# Altium schematic symbol library jlcpcb_2025_04_capacitors_extended_1210.schlib: 709 symbols (part 4 of 4) (continued)
## HMK325C7475KMHPE
designator C?  Capacitance: 4.7uF  (hidden comment: *)
Capacitor, Ceramic (MLCC), 4.7uF, ±10%, 100V, X7S, ±10%, SMD 1210; Manufacturer: Taiyo Yuden; Manufacturer Part Number: HMK325C7475KMHPE; Package Size: 1210; JLCPCB Basic Part: No; JLCPCB Part Number: C385986; Supplier 1: LCSC; Category: Capacitors - MLCC; Supplier Part Number 1: C385986; Tolerance: ±10%; Voltage Rating: 100V; Temperature Coefficient: X7S; RoHS: Yes; ComponentLink1Description: Datasheet; ComponentLink1URL: https://wmsc.lcsc.com/wmsc/upload/file/pdf/v2/lcsc/2211282230_Taiyo-Yuden-HMK325C7475KMHPE_C385986.pdf; ComponentLink2Description: JLCPCB Part URL; ComponentLink2URL: https://jlcpcb.com/partdetail/C385986; ComponentLink3Description: LCSC Part URL; ComponentLink3URL: https://lcsc.com/product-detail/Multilayer-Ceramic-Capacitors-MLCC---SMD-SMT_Taiyo-Yuden-Taiyo-Yuden-HMK325C7475KMHPE_C385986.html
footprint CAP-1210 (1210 (3225M) Capacitor)
pins: 1, 2

## HMK325C7475KN-TE
designator C?  Capacitance: 4.7uF  (hidden comment: *)
Capacitor, Ceramic (MLCC), 4.7uF, ±10%, 100V, X7S, ±10%, SMD 1210; Manufacturer: Taiyo Yuden; Manufacturer Part Number: HMK325C7475KN-TE; Package Size: 1210; JLCPCB Basic Part: No; JLCPCB Part Number: C697607; Supplier 1: LCSC; Category: Capacitors - MLCC; Supplier Part Number 1: C697607; Tolerance: ±10%; Voltage Rating: 100V; Temperature Coefficient: X7S; RoHS: Yes; ComponentLink1Description: Datasheet; ComponentLink1URL: https://wmsc.lcsc.com/wmsc/upload/file/pdf/v2/lcsc/2309191034_Taiyo-Yuden-HMK325C7475KN-TE_C697607.pdf; ComponentLink2Description: JLCPCB Part URL; ComponentLink2URL: https://jlcpcb.com/partdetail/C697607; ComponentLink3Description: LCSC Part URL; ComponentLink3URL: https://lcsc.com/product-detail/Multilayer-Ceramic-Capacitors-MLCC---SMD-SMT_Taiyo-Yuden-Taiyo-Yuden-HMK325C7475KN-TE_C697607.html
footprint CAP-1210 (1210 (3225M) Capacitor)
pins: 1, 2

## JMK325ABJ107MM-P
designator C?  Capacitance: 100uF  (hidden comment: *)
Capacitor, Ceramic (MLCC), 100uF, ±20%, 6.3V, X5R, ±20%, SMD 1210; Manufacturer: Taiyo Yuden; Manufacturer Part Number: JMK325ABJ107MM-P; Package Size: 1210; JLCPCB Basic Part: No; JLCPCB Part Number: C386025; Supplier 1: LCSC; Category: Capacitors - MLCC; Supplier Part Number 1: C386025; Tolerance: ±20%; Voltage Rating: 6.3V; Temperature Coefficient: X5R; RoHS: Yes; ComponentLink1Description: Datasheet; ComponentLink1URL: https://wmsc.lcsc.com/wmsc/upload/file/pdf/v2/lcsc/2304140030_Taiyo-Yuden-JMK325ABJ107MM-P_C386025.pdf; ComponentLink2Description: JLCPCB Part URL; ComponentLink2URL: https://jlcpcb.com/partdetail/C386025; ComponentLink3Description: LCSC Part URL; ComponentLink3URL: https://lcsc.com/product-detail/Multilayer-Ceramic-Capacitors-MLCC---SMD-SMT_Taiyo-Yuden-Taiyo-Yuden-JMK325ABJ107MM-P_C386025.html
footprint CAP-1210 (1210 (3225M) Capacitor)
pins: 1, 2

## JMK325ABJ107MM-T
designator C?  Capacitance: 100uF  (hidden comment: *)
Capacitor, Ceramic (MLCC), 100uF, ±20%, 6.3V, X5R, ±20%, SMD 1210; Manufacturer: Taiyo Yuden; Manufacturer Part Number: JMK325ABJ107MM-T; Package Size: 1210; JLCPCB Basic Part: No; JLCPCB Part Number: C92794; Supplier 1: LCSC; Category: Capacitors - MLCC; Supplier Part Number 1: C92794; Tolerance: ±20%; Voltage Rating: 6.3V; Temperature Coefficient: X5R; RoHS: Yes; ComponentLink1Description: Datasheet; ComponentLink1URL: https://wmsc.lcsc.com/wmsc/upload/file/pdf/v2/lcsc/1811081920_Taiyo-Yuden-JMK325ABJ107MM-T_C92794.pdf; ComponentLink2Description: JLCPCB Part URL; ComponentLink2URL: https://jlcpcb.com/partdetail/C92794; ComponentLink3Description: LCSC Part URL; ComponentLink3URL: https://lcsc.com/product-detail/Multilayer-Ceramic-Capacitors-MLCC---SMD-SMT_Taiyo-Yuden-Taiyo-Yuden-JMK325ABJ107MM-T_C92794.html
footprint CAP-1210 (1210 (3225M) Capacitor)
pins: 1, 2

## JMK325ABJ227MM-P
designator C?  Capacitance: 220uF  (hidden comment: *)
Capacitor, Ceramic (MLCC), 220uF, ±20%, 6.3V, X5R, ±20%, SMD 1210; Manufacturer: Taiyo Yuden; Manufacturer Part Number: JMK325ABJ227MM-P; Package Size: 1210; JLCPCB Basic Part: No; JLCPCB Part Number: C454524; Supplier 1: LCSC; Category: Capacitors - MLCC; Supplier Part Number 1: C454524; Tolerance: ±20%; Voltage Rating: 6.3V; Temperature Coefficient: X5R; RoHS: Yes; ComponentLink1Description: Datasheet; ComponentLink1URL: https://wmsc.lcsc.com/wmsc/upload/file/pdf/v2/lcsc/2304140030_Taiyo-Yuden-JMK325ABJ227MM-P_C454524.pdf; ComponentLink2Description: JLCPCB Part URL; ComponentLink2URL: https://jlcpcb.com/partdetail/C454524; ComponentLink3Description: LCSC Part URL; ComponentLink3URL: https://lcsc.com/product-detail/Multilayer-Ceramic-Capacitors-MLCC---SMD-SMT_Taiyo-Yuden-Taiyo-Yuden-JMK325ABJ227MM-P_C454524.html
footprint CAP-1210 (1210 (3225M) Capacitor)
pins: 1, 2

## JMK325B7476KMHPR
designator C?  Capacitance: 47uF  (hidden comment: *)
Capacitor, Ceramic (MLCC), 47uF, ±10%, 6.3V, X7R, ±10%, SMD 1210; Manufacturer: Taiyo Yuden; Manufacturer Part Number: JMK325B7476KMHPR; Package Size: 1210; JLCPCB Basic Part: No; JLCPCB Part Number: C386026; Supplier 1: LCSC; Category: Capacitors - MLCC; Supplier Part Number 1: C386026; Tolerance: ±10%; Voltage Rating: 6.3V; Temperature Coefficient: X7R; RoHS: Yes; ComponentLink1Description: Datasheet; ComponentLink1URL: https://wmsc.lcsc.com/wmsc/upload/file/pdf/v2/lcsc/2304140030_Taiyo-Yuden-JMK325B7476KMHPR_C386026.pdf; ComponentLink2Description: JLCPCB Part URL; ComponentLink2URL: https://jlcpcb.com/partdetail/C386026; ComponentLink3Description: LCSC Part URL; ComponentLink3URL: https://lcsc.com/product-detail/Multilayer-Ceramic-Capacitors-MLCC---SMD-SMT_Taiyo-Yuden-Taiyo-Yuden-JMK325B7476KMHPR_C386026.html
footprint CAP-1210 (1210 (3225M) Capacitor)
pins: 1, 2

## JMK325BJ107MM-T
designator C?  Capacitance: 100uF  (hidden comment: *)
Capacitor, Ceramic (MLCC), 100uF, ±20%, 6.3V, X5R, ±20%, SMD 1210; Manufacturer: Taiyo Yuden; Manufacturer Part Number: JMK325BJ107MM-T; Package Size: 1210; JLCPCB Basic Part: No; JLCPCB Part Number: C191180; Supplier 1: LCSC; Category: Capacitors - MLCC; Supplier Part Number 1: C191180; Tolerance: ±20%; Voltage Rating: 6.3V; Temperature Coefficient: X5R; RoHS: Yes; ComponentLink1Description: Datasheet; ComponentLink1URL: https://wmsc.lcsc.com/wmsc/upload/file/pdf/v2/lcsc/2304140030_Taiyo-Yuden-JMK325BJ107MM-T_C191180.pdf; ComponentLink2Description: JLCPCB Part URL; ComponentLink2URL: https://jlcpcb.com/partdetail/C191180; ComponentLink3Description: LCSC Part URL; ComponentLink3URL: https://lcsc.com/product-detail/Multilayer-Ceramic-Capacitors-MLCC---SMD-SMT_Taiyo-Yuden-Taiyo-Yuden-JMK325BJ107MM-T_C191180.html
footprint CAP-1210 (1210 (3225M) Capacitor)
pins: 1, 2

## JMK325BJ476MM-P
designator C?  Capacitance: 47uF  (hidden comment: *)
Capacitor, Ceramic (MLCC), 47uF, ±20%, 6.3V, X5R, ±20%, SMD 1210; Manufacturer: Taiyo Yuden; Manufacturer Part Number: JMK325BJ476MM-P; Package Size: 1210; JLCPCB Basic Part: No; JLCPCB Part Number: C386030; Supplier 1: LCSC; Category: Capacitors - MLCC; Supplier Part Number 1: C386030; Tolerance: ±20%; Voltage Rating: 6.3V; Temperature Coefficient: X5R; RoHS: Yes; ComponentLink1Description: Datasheet; ComponentLink1URL: https://wmsc.lcsc.com/wmsc/upload/file/pdf/v2/lcsc/2108160930_Taiyo-Yuden-JMK325BJ476MM-P_C386030.pdf; ComponentLink2Description: JLCPCB Part URL; ComponentLink2URL: https://jlcpcb.com/partdetail/C386030; ComponentLink3Description: LCSC Part URL; ComponentLink3URL: https://lcsc.com/product-detail/Multilayer-Ceramic-Capacitors-MLCC---SMD-SMT_Taiyo-Yuden-Taiyo-Yuden-JMK325BJ476MM-P_C386030.html
footprint CAP-1210 (1210 (3225M) Capacitor)
pins: 1, 2

## JMK325BJ476MM-T
designator C?  Capacitance: 47uF  (hidden comment: *)
Capacitor, Ceramic (MLCC), 47uF, ±20%, 6.3V, X5R, ±20%, SMD 1210; Manufacturer: Taiyo Yuden; Manufacturer Part Number: JMK325BJ476MM-T; Package Size: 1210; JLCPCB Basic Part: No; JLCPCB Part Number: C92795; Supplier 1: LCSC; Category: Capacitors - MLCC; Supplier Part Number 1: C92795; Tolerance: ±20%; Voltage Rating: 6.3V; Temperature Coefficient: X5R; RoHS: Yes; ComponentLink1Description: Datasheet; ComponentLink1URL: https://wmsc.lcsc.com/wmsc/upload/file/pdf/v2/lcsc/1810171818_Taiyo-Yuden-JMK325BJ476MM-T_C92795.pdf; ComponentLink2Description: JLCPCB Part URL; ComponentLink2URL: https://jlcpcb.com/partdetail/C92795; ComponentLink3Description: LCSC Part URL; ComponentLink3URL: https://lcsc.com/product-detail/Multilayer-Ceramic-Capacitors-MLCC---SMD-SMT_Taiyo-Yuden-Taiyo-Yuden-JMK325BJ476MM-T_C92795.html
footprint CAP-1210 (1210 (3225M) Capacitor)
pins: 1, 2

## LMK325ABJ107MM-P
designator C?  Capacitance: 100uF  (hidden comment: *)
Capacitor, Ceramic (MLCC), 100uF, ±20%, 10V, X5R, ±20%, SMD 1210; Manufacturer: Taiyo Yuden; Manufacturer Part Number: LMK325ABJ107MM-P; Package Size: 1210; JLCPCB Basic Part: No; JLCPCB Part Number: C386065; Supplier 1: LCSC; Category: Capacitors - MLCC; Supplier Part Number 1: C386065; Tolerance: ±20%; Voltage Rating: 10V; Temperature Coefficient: X5R; RoHS: Yes; ComponentLink1Description: Datasheet; ComponentLink1URL: https://wmsc.lcsc.com/wmsc/upload/file/pdf/v2/lcsc/2108161130_Taiyo-Yuden-LMK325ABJ107MM-P_C386065.pdf; ComponentLink2Description: JLCPCB Part URL; ComponentLink2URL: https://jlcpcb.com/partdetail/C386065; ComponentLink3Description: LCSC Part URL; ComponentLink3URL: https://lcsc.com/product-detail/Multilayer-Ceramic-Capacitors-MLCC---SMD-SMT_Taiyo-Yuden-Taiyo-Yuden-LMK325ABJ107MM-P_C386065.html
footprint CAP-1210 (1210 (3225M) Capacitor)
pins: 1, 2

## LMK325ABJ107MM-T
designator C?  Capacitance: 100uF  (hidden comment: *)
Capacitor, Ceramic (MLCC), 100uF, ±20%, 10V, X5R, ±20%, SMD 1210; Manufacturer: Taiyo Yuden; Manufacturer Part Number: LMK325ABJ107MM-T; Package Size: 1210; JLCPCB Basic Part: No; JLCPCB Part Number: C2880380; Supplier 1: LCSC; Category: Capacitors - MLCC; Supplier Part Number 1: C2880380; Tolerance: ±20%; Voltage Rating: 10V; Temperature Coefficient: X5R; RoHS: Yes; ComponentLink1Description: Datasheet; ComponentLink1URL: https://wmsc.lcsc.com/wmsc/upload/file/pdf/v2/lcsc/2108160930_Taiyo-Yuden-LMK325ABJ107MM-T_C2880380.pdf; ComponentLink2Description: JLCPCB Part URL; ComponentLink2URL: https://jlcpcb.com/partdetail/C2880380; ComponentLink3Description: LCSC Part URL; ComponentLink3URL: https://lcsc.com/product-detail/Multilayer-Ceramic-Capacitors-MLCC---SMD-SMT_Taiyo-Yuden-Taiyo-Yuden-LMK325ABJ107MM-T_C2880380.html
footprint CAP-1210 (1210 (3225M) Capacitor)
pins: 1, 2

## LMK325AC6107MM-P
designator C?  Capacitance: 100uF  (hidden comment: *)
Capacitor, Ceramic (MLCC), 100uF, ±20%, 10V, X6S, ±20%, SMD 1210; Manufacturer: Taiyo Yuden; Manufacturer Part Number: LMK325AC6107MM-P; Package Size: 1210; JLCPCB Basic Part: No; JLCPCB Part Number: C2179747; Supplier 1: LCSC; Category: Capacitors - MLCC; Supplier Part Number 1: C2179747; Tolerance: ±20%; Voltage Rating: 10V; Temperature Coefficient: X6S; RoHS: Yes; ComponentLink1Description: Datasheet; ComponentLink1URL: https://wmsc.lcsc.com/wmsc/upload/file/pdf/v2/lcsc/2309051423_Taiyo-Yuden-LMK325AC6107MM-P_C2179747.pdf; ComponentLink2Description: JLCPCB Part URL; ComponentLink2URL: https://jlcpcb.com/partdetail/C2179747; ComponentLink3Description: LCSC Part URL; ComponentLink3URL: https://lcsc.com/product-detail/Multilayer-Ceramic-Capacitors-MLCC---SMD-SMT_Taiyo-Yuden-Taiyo-Yuden-LMK325AC6107MM-P_C2179747.html
footprint CAP-1210 (1210 (3225M) Capacitor)
pins: 1, 2

## LMK325BJ106KN-T
designator C?  Capacitance: 10uF  (hidden comment: *)
Capacitor, Ceramic (MLCC), 10uF, ±10%, 10V, X5R, ±10%, SMD 1210; Manufacturer: Taiyo Yuden; Manufacturer Part Number: LMK325BJ106KN-T; Package Size: 1210; JLCPCB Basic Part: No; JLCPCB Part Number: C2179476; Supplier 1: LCSC; Category: Capacitors - MLCC; Supplier Part Number 1: C2179476; Tolerance: ±10%; Voltage Rating: 10V; Temperature Coefficient: X5R; RoHS: Yes; ComponentLink1Description: Datasheet; ComponentLink1URL: https://wmsc.lcsc.com/wmsc/upload/file/pdf/v2/lcsc/2309051412_Taiyo-Yuden-LMK325BJ106KN-T_C2179476.pdf; ComponentLink2Description: JLCPCB Part URL; ComponentLink2URL: https://jlcpcb.com/partdetail/C2179476; ComponentLink3Description: LCSC Part URL; ComponentLink3URL: https://lcsc.com/product-detail/Multilayer-Ceramic-Capacitors-MLCC---SMD-SMT_Taiyo-Yuden-Taiyo-Yuden-LMK325BJ106KN-T_C2179476.html
footprint CAP-1210 (1210 (3225M) Capacitor)
pins: 1, 2

## LMK325BJ107MM-T
designator C?  Capacitance: 100uF  (hidden comment: *)
Capacitor, Ceramic (MLCC), 100uF, ±20%, 10V, X5R, ±20%, SMD 1210; Manufacturer: Taiyo Yuden; Manufacturer Part Number: LMK325BJ107MM-T; Package Size: 1210; JLCPCB Basic Part: No; JLCPCB Part Number: C92822; Supplier 1: LCSC; Category: Capacitors - MLCC; Supplier Part Number 1: C92822; Tolerance: ±20%; Voltage Rating: 10V; Temperature Coefficient: X5R; RoHS: Yes; ComponentLink1Description: Datasheet; ComponentLink1URL: https://wmsc.lcsc.com/wmsc/upload/file/pdf/v2/lcsc/2211282300_Taiyo-Yuden-LMK325BJ107MM-T_C92822.pdf; ComponentLink2Description: JLCPCB Part URL; ComponentLink2URL: https://jlcpcb.com/partdetail/C92822; ComponentLink3Description: LCSC Part URL; ComponentLink3URL: https://lcsc.com/product-detail/Multilayer-Ceramic-Capacitors-MLCC---SMD-SMT_Taiyo-Yuden-Taiyo-Yuden-LMK325BJ107MM-T_C92822.html
footprint CAP-1210 (1210 (3225M) Capacitor)
pins: 1, 2

## LMK325BJ226KM-T
designator C?  Capacitance: 22uF  (hidden comment: *)
Capacitor, Ceramic (MLCC), 22uF, ±10%, 10V, X5R, ±10%, SMD 1210; Manufacturer: Taiyo Yuden; Manufacturer Part Number: LMK325BJ226KM-T; Package Size: 1210; JLCPCB Basic Part: No; JLCPCB Part Number: C92823; Supplier 1: LCSC; Category: Capacitors - MLCC; Supplier Part Number 1: C92823; Tolerance: ±10%; Voltage Rating: 10V; Temperature Coefficient: X5R; RoHS: Yes; ComponentLink1Description: Datasheet; ComponentLink1URL: https://wmsc.lcsc.com/wmsc/upload/file/pdf/v2/lcsc/1810231523_Taiyo-Yuden-LMK325BJ226KM-T_C92823.pdf; ComponentLink2Description: JLCPCB Part URL; ComponentLink2URL: https://jlcpcb.com/partdetail/C92823; ComponentLink3Description: LCSC Part URL; ComponentLink3URL: https://lcsc.com/product-detail/Multilayer-Ceramic-Capacitors-MLCC---SMD-SMT_Taiyo-Yuden-Taiyo-Yuden-LMK325BJ226KM-T_C92823.html
footprint CAP-1210 (1210 (3225M) Capacitor)
pins: 1, 2

## LMK325BJ476KMHP
designator C?  Capacitance: 47uF  (hidden comment: *)
Capacitor, Ceramic (MLCC), 47uF, ±10%, 10V, X5R, ±10%, SMD 1210; Manufacturer: Taiyo Yuden; Manufacturer Part Number: LMK325BJ476KMHP; Package Size: 1210; JLCPCB Basic Part: No; JLCPCB Part Number: C650970; Supplier 1: LCSC; Category: Capacitors - MLCC; Supplier Part Number 1: C650970; Tolerance: ±10%; Voltage Rating: 10V; Temperature Coefficient: X5R; RoHS: Yes; ComponentLink1Description: Datasheet; ComponentLink1URL: https://wmsc.lcsc.com/wmsc/upload/file/pdf/v2/lcsc/2304140030_Taiyo-Yuden-LMK325BJ476KMHP_C650970.pdf; ComponentLink2Description: JLCPCB Part URL; ComponentLink2URL: https://jlcpcb.com/partdetail/C650970; ComponentLink3Description: LCSC Part URL; ComponentLink3URL: https://lcsc.com/product-detail/Multilayer-Ceramic-Capacitors-MLCC---SMD-SMT_Taiyo-Yuden-Taiyo-Yuden-LMK325BJ476KMHP_C650970.html
footprint CAP-1210 (1210 (3225M) Capacitor)
pins: 1, 2

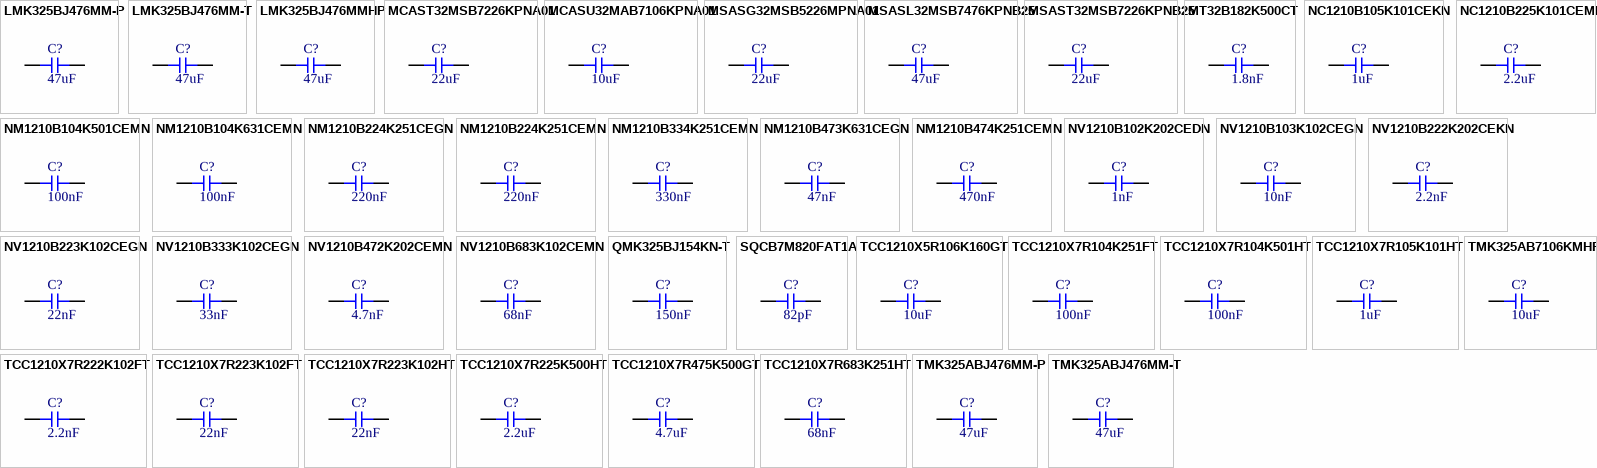
[diagram p16: symbols LMK325BJ476MM-P to TMK325ABJ476MM-T]

## LMK325BJ476MM-P
designator C?  Capacitance: 47uF  (hidden comment: *)
Capacitor, Ceramic (MLCC), 47uF, ±20%, 10V, X5R, ±20%, SMD 1210; Manufacturer: Taiyo Yuden; Manufacturer Part Number: LMK325BJ476MM-P; Package Size: 1210; JLCPCB Basic Part: No; JLCPCB Part Number: C2802164; Supplier 1: LCSC; Category: Capacitors - MLCC; Supplier Part Number 1: C2802164; Tolerance: ±20%; Voltage Rating: 10V; Temperature Coefficient: X5R; RoHS: Yes; ComponentLink1Description: Datasheet; ComponentLink1URL: https://wmsc.lcsc.com/wmsc/upload/file/pdf/v2/lcsc/2304140030_Taiyo-Yuden-LMK325BJ476MM-P_C2802164.pdf; ComponentLink2Description: JLCPCB Part URL; ComponentLink2URL: https://jlcpcb.com/partdetail/C2802164; ComponentLink3Description: LCSC Part URL; ComponentLink3URL: https://lcsc.com/product-detail/Multilayer-Ceramic-Capacitors-MLCC---SMD-SMT_Taiyo-Yuden-Taiyo-Yuden-LMK325BJ476MM-P_C2802164.html
footprint CAP-1210 (1210 (3225M) Capacitor)
pins: 1, 2

## LMK325BJ476MM-T
designator C?  Capacitance: 47uF  (hidden comment: *)
Capacitor, Ceramic (MLCC), 47uF, ±20%, 10V, X5R, ±20%, SMD 1210; Manufacturer: Taiyo Yuden; Manufacturer Part Number: LMK325BJ476MM-T; Package Size: 1210; JLCPCB Basic Part: No; JLCPCB Part Number: C92824; Supplier 1: LCSC; Category: Capacitors - MLCC; Supplier Part Number 1: C92824; Tolerance: ±20%; Voltage Rating: 10V; Temperature Coefficient: X5R; RoHS: Yes; ComponentLink1Description: Datasheet; ComponentLink1URL: https://wmsc.lcsc.com/wmsc/upload/file/pdf/v2/lcsc/2211282300_Taiyo-Yuden-LMK325BJ476MM-T_C92824.pdf; ComponentLink2Description: JLCPCB Part URL; ComponentLink2URL: https://jlcpcb.com/partdetail/C92824; ComponentLink3Description: LCSC Part URL; ComponentLink3URL: https://lcsc.com/product-detail/Multilayer-Ceramic-Capacitors-MLCC---SMD-SMT_Taiyo-Yuden-Taiyo-Yuden-LMK325BJ476MM-T_C92824.html
footprint CAP-1210 (1210 (3225M) Capacitor)
pins: 1, 2

## LMK325BJ476MMHP
designator C?  Capacitance: 47uF  (hidden comment: *)
Capacitor, Ceramic (MLCC), 47uF, ±20%, 10V, X5R, ±20%, SMD 1210; Manufacturer: Taiyo Yuden; Manufacturer Part Number: LMK325BJ476MMHP; Package Size: 1210; JLCPCB Basic Part: No; JLCPCB Part Number: C386068; Supplier 1: LCSC; Category: Capacitors - MLCC; Supplier Part Number 1: C386068; Tolerance: ±20%; Voltage Rating: 10V; Temperature Coefficient: X5R; RoHS: Yes; ComponentLink1Description: Datasheet; ComponentLink1URL: https://wmsc.lcsc.com/wmsc/upload/file/pdf/v2/lcsc/2105241210_Taiyo-Yuden-LMK325BJ476MMHP_C386068.pdf; ComponentLink2Description: JLCPCB Part URL; ComponentLink2URL: https://jlcpcb.com/partdetail/C386068; ComponentLink3Description: LCSC Part URL; ComponentLink3URL: https://lcsc.com/product-detail/Multilayer-Ceramic-Capacitors-MLCC---SMD-SMT_Taiyo-Yuden-Taiyo-Yuden-LMK325BJ476MMHP_C386068.html
footprint CAP-1210 (1210 (3225M) Capacitor)
pins: 1, 2

## MCAST32MSB7226KPNA01
designator C?  Capacitance: 22uF  (hidden comment: *)
Capacitor, Ceramic (MLCC), 22uF, ±10%, 25V, ±10%, SMD 1210; Manufacturer: Taiyo Yuden; Manufacturer Part Number: MCAST32MSB7226KPNA01; Package Size: 1210; JLCPCB Basic Part: No; JLCPCB Part Number: C5372271; Supplier 1: LCSC; Category: Capacitors - MLCC; Supplier Part Number 1: C5372271; Tolerance: ±10%; Voltage Rating: 25V; RoHS: Yes; ComponentLink1Description: Datasheet; ComponentLink1URL: https://wmsc.lcsc.com/wmsc/upload/file/pdf/v2/lcsc/2303140930_Taiyo-Yuden-MCAST32MSB7226KPNA01_C5372271.pdf; ComponentLink2Description: JLCPCB Part URL; ComponentLink2URL: https://jlcpcb.com/partdetail/C5372271; ComponentLink3Description: LCSC Part URL; ComponentLink3URL: https://lcsc.com/product-detail/Multilayer-Ceramic-Capacitors-MLCC---SMD-SMT_Taiyo-Yuden-Taiyo-Yuden-MCAST32MSB7226KPNA01_C5372271.html
footprint CAP-1210 (1210 (3225M) Capacitor)
pins: 1, 2

## MCASU32MAB7106KPNA01
designator C?  Capacitance: 10uF  (hidden comment: *)
Capacitor, Ceramic (MLCC), 10uF, ±10%, 50V, X7R, ±10%, SMD 1210; Manufacturer: Taiyo Yuden; Manufacturer Part Number: MCASU32MAB7106KPNA01; Package Size: 1210; JLCPCB Basic Part: No; JLCPCB Part Number: C5796173; Supplier 1: LCSC; Category: Capacitors - MLCC; Supplier Part Number 1: C5796173; Tolerance: ±10%; Voltage Rating: 50V; Temperature Coefficient: X7R; RoHS: Yes; ComponentLink1Description: Datasheet; ComponentLink1URL: https://wmsc.lcsc.com/wmsc/upload/file/pdf/v2/lcsc/2402010545_Taiyo-Yuden-MCASU32MAB7106KPNA01_C5796173.pdf; ComponentLink2Description: JLCPCB Part URL; ComponentLink2URL: https://jlcpcb.com/partdetail/C5796173; ComponentLink3Description: LCSC Part URL; ComponentLink3URL: https://lcsc.com/product-detail/Multilayer-Ceramic-Capacitors-MLCC---SMD-SMT_Taiyo-Yuden-Taiyo-Yuden-MCASU32MAB7106KPNA01_C5796173.html
footprint CAP-1210 (1210 (3225M) Capacitor)
pins: 1, 2

## MSASG32MSB5226MPNA01
designator C?  Capacitance: 22uF  (hidden comment: *)
Capacitor, Ceramic (MLCC), 22uF, ±20%, 35V, X5R, ±20%, SMD 1210; Manufacturer: Taiyo Yuden; Manufacturer Part Number: MSASG32MSB5226MPNA01; Package Size: 1210; JLCPCB Basic Part: No; JLCPCB Part Number: C5785350; Supplier 1: LCSC; Category: Capacitors - MLCC; Supplier Part Number 1: C5785350; Tolerance: ±20%; Voltage Rating: 35V; Temperature Coefficient: X5R; RoHS: Yes; ComponentLink1Description: Datasheet; ComponentLink2Description: JLCPCB Part URL; ComponentLink2URL: https://jlcpcb.com/partdetail/C5785350; ComponentLink3Description: LCSC Part URL; ComponentLink3URL: https://lcsc.com/product-detail/Multilayer-Ceramic-Capacitors-MLCC---SMD-SMT_Taiyo-Yuden-Taiyo-Yuden-MSASG32MSB5226MPNA01_C5785350.html
footprint CAP-1210 (1210 (3225M) Capacitor)
pins: 1, 2

## MSASL32MSB7476KPNB25
designator C?  Capacitance: 47uF  (hidden comment: *)
Capacitor, Ceramic (MLCC), 47uF, ±10%, 10V, X7R, ±10%, SMD 1210; Manufacturer: Taiyo Yuden; Manufacturer Part Number: MSASL32MSB7476KPNB25; Package Size: 1210; JLCPCB Basic Part: No; JLCPCB Part Number: C778723; Supplier 1: LCSC; Category: Capacitors - MLCC; Supplier Part Number 1: C778723; Tolerance: ±10%; Voltage Rating: 10V; Temperature Coefficient: X7R; RoHS: Yes; ComponentLink1Description: Datasheet; ComponentLink1URL: https://wmsc.lcsc.com/wmsc/upload/file/pdf/v2/lcsc/2404161124_Taiyo-Yuden-MSASL32MSB7476KPNB25_C778723.pdf; ComponentLink2Description: JLCPCB Part URL; ComponentLink2URL: https://jlcpcb.com/partdetail/C778723; ComponentLink3Description: LCSC Part URL; ComponentLink3URL: https://lcsc.com/product-detail/Multilayer-Ceramic-Capacitors-MLCC---SMD-SMT_Taiyo-Yuden-Taiyo-Yuden-MSASL32MSB7476KPNB25_C778723.html
footprint CAP-1210 (1210 (3225M) Capacitor)
pins: 1, 2

## MSAST32MSB7226KPNB25
designator C?  Capacitance: 22uF  (hidden comment: *)
Capacitor, Ceramic (MLCC), 22uF, ±10%, 25V, X7R, ±10%, SMD 1210; Manufacturer: Taiyo Yuden; Manufacturer Part Number: MSAST32MSB7226KPNB25; Package Size: 1210; JLCPCB Basic Part: No; JLCPCB Part Number: C7235328; Supplier 1: LCSC; Category: Capacitors - MLCC; Supplier Part Number 1: C7235328; Tolerance: ±10%; Voltage Rating: 25V; Temperature Coefficient: X7R; RoHS: Yes; ComponentLink1Description: Datasheet; ComponentLink2Description: JLCPCB Part URL; ComponentLink2URL: https://jlcpcb.com/partdetail/C7235328; ComponentLink3Description: LCSC Part URL; ComponentLink3URL: https://lcsc.com/product-detail/Multilayer-Ceramic-Capacitors-MLCC---SMD-SMT_Taiyo-Yuden-Taiyo-Yuden-MSAST32MSB7226KPNB25_C7235328.html
footprint CAP-1210 (1210 (3225M) Capacitor)
pins: 1, 2

## MT32B182K500CT
designator C?  Capacitance: 1.8nF  (hidden comment: *)
Capacitor, Ceramic (MLCC), 1.8nF, 50V, X7R, SMD 1210; Manufacturer: Walsin Tech Corp; Manufacturer Part Number: MT32B182K500CT; Package Size: 1210; JLCPCB Basic Part: No; JLCPCB Part Number: C2918686; Supplier 1: LCSC; Category: Capacitors - MLCC; Supplier Part Number 1: C2918686; Voltage Rating: 50V; Temperature Coefficient: X7R; RoHS: Yes; ComponentLink1Description: Datasheet; ComponentLink1URL: https://wmsc.lcsc.com/wmsc/upload/file/pdf/v2/lcsc/2111171830_Walsin-Tech-Corp-MT32B182K500CT_C2918686.pdf; ComponentLink2Description: JLCPCB Part URL; ComponentLink2URL: https://jlcpcb.com/partdetail/C2918686; ComponentLink3Description: LCSC Part URL; ComponentLink3URL: https://lcsc.com/product-detail/Multilayer-Ceramic-Capacitors-MLCC---SMD-SMT_Walsin-Tech-Corp-Walsin-Tech-Corp-MT32B182K500CT_C2918686.html
footprint CAP-1210 (1210 (3225M) Capacitor)
pins: 1, 2

## NC1210B105K101CEKN
designator C?  Capacitance: 1uF  (hidden comment: *)
Capacitor, Ceramic (MLCC), 1uF, ±10%, 100V, ±10%, SMD 1210; Manufacturer: HUI JU; Manufacturer Part Number: NC1210B105K101CEKN; Package Size: 1210; JLCPCB Basic Part: No; JLCPCB Part Number: C841573; Supplier 1: LCSC; Category: Capacitors - MLCC; Supplier Part Number 1: C841573; Tolerance: ±10%; Voltage Rating: 100V; RoHS: Yes; ComponentLink1Description: Datasheet; ComponentLink1URL: https://wmsc.lcsc.com/wmsc/upload/file/pdf/v2/lcsc/2304140030_HUI-JU-NC1210B105K101CEKN_C841573.pdf; ComponentLink2Description: JLCPCB Part URL; ComponentLink2URL: https://jlcpcb.com/partdetail/C841573; ComponentLink3Description: LCSC Part URL; ComponentLink3URL: https://lcsc.com/product-detail/Multilayer-Ceramic-Capacitors-MLCC---SMD-SMT_HUI-JU-HUI-JU-NC1210B105K101CEKN_C841573.html
footprint CAP-1210 (1210 (3225M) Capacitor)
pins: 1, 2

## NC1210B225K101CEMN
designator C?  Capacitance: 2.2uF  (hidden comment: *)
Capacitor, Ceramic (MLCC), 2.2uF, ±10%, 100V, X7R, ±10%, SMD 1210; Manufacturer: HUI JU; Manufacturer Part Number: NC1210B225K101CEMN; Package Size: 1210; JLCPCB Basic Part: No; JLCPCB Part Number: C840133; Supplier 1: LCSC; Category: Capacitors - MLCC; Supplier Part Number 1: C840133; Tolerance: ±10%; Voltage Rating: 100V; Temperature Coefficient: X7R; RoHS: Yes; ComponentLink1Description: Datasheet; ComponentLink1URL: https://wmsc.lcsc.com/wmsc/upload/file/pdf/v2/lcsc/2304140030_HUI-JU-NC1210B225K101CEMN_C840133.pdf; ComponentLink2Description: JLCPCB Part URL; ComponentLink2URL: https://jlcpcb.com/partdetail/C840133; ComponentLink3Description: LCSC Part URL; ComponentLink3URL: https://lcsc.com/product-detail/Multilayer-Ceramic-Capacitors-MLCC---SMD-SMT_HUI-JU-HUI-JU-NC1210B225K101CEMN_C840133.html
footprint CAP-1210 (1210 (3225M) Capacitor)
pins: 1, 2

## NM1210B104K501CEMN
designator C?  Capacitance: 100nF  (hidden comment: *)
Capacitor, Ceramic (MLCC), 100nF, ±10%, 500V, X7R, ±10%, SMD 1210; Manufacturer: HUI JU; Manufacturer Part Number: NM1210B104K501CEMN; Package Size: 1210; JLCPCB Basic Part: No; JLCPCB Part Number: C784430; Supplier 1: LCSC; Category: Capacitors - MLCC; Supplier Part Number 1: C784430; Tolerance: ±10%; Voltage Rating: 500V; Temperature Coefficient: X7R; RoHS: Yes; ComponentLink1Description: Datasheet; ComponentLink1URL: https://wmsc.lcsc.com/wmsc/upload/file/pdf/v2/lcsc/2304140030_HUI-JU-NM1210B104K501CEMN_C784430.pdf; ComponentLink2Description: JLCPCB Part URL; ComponentLink2URL: https://jlcpcb.com/partdetail/C784430; ComponentLink3Description: LCSC Part URL; ComponentLink3URL: https://lcsc.com/product-detail/Multilayer-Ceramic-Capacitors-MLCC---SMD-SMT_HUI-JU-HUI-JU-NM1210B104K501CEMN_C784430.html
footprint CAP-1210 (1210 (3225M) Capacitor)
pins: 1, 2

## NM1210B104K631CEMN
designator C?  Capacitance: 100nF  (hidden comment: *)
Capacitor, Ceramic (MLCC), 100nF, ±10%, 630V, ±10%, SMD 1210; Manufacturer: HUI JU; Manufacturer Part Number: NM1210B104K631CEMN; Package Size: 1210; JLCPCB Basic Part: No; JLCPCB Part Number: C784432; Supplier 1: LCSC; Category: Capacitors - MLCC; Supplier Part Number 1: C784432; Tolerance: ±10%; Voltage Rating: 630V; RoHS: Yes; ComponentLink1Description: Datasheet; ComponentLink1URL: https://wmsc.lcsc.com/wmsc/upload/file/pdf/v2/lcsc/2304140030_HUI-JU-NM1210B104K631CEMN_C784432.pdf; ComponentLink2Description: JLCPCB Part URL; ComponentLink2URL: https://jlcpcb.com/partdetail/C784432; ComponentLink3Description: LCSC Part URL; ComponentLink3URL: https://lcsc.com/product-detail/Multilayer-Ceramic-Capacitors-MLCC---SMD-SMT_HUI-JU-HUI-JU-NM1210B104K631CEMN_C784432.html
footprint CAP-1210 (1210 (3225M) Capacitor)
pins: 1, 2

## NM1210B224K251CEGN
designator C?  Capacitance: 220nF  (hidden comment: *)
Capacitor, Ceramic (MLCC), 220nF, ±10%, 250V, ±10%, SMD 1210; Manufacturer: HUI JU; Manufacturer Part Number: NM1210B224K251CEGN; Package Size: 1210; JLCPCB Basic Part: No; JLCPCB Part Number: C841576; Supplier 1: LCSC; Category: Capacitors - MLCC; Supplier Part Number 1: C841576; Tolerance: ±10%; Voltage Rating: 250V; RoHS: Yes; ComponentLink1Description: Datasheet; ComponentLink1URL: https://wmsc.lcsc.com/wmsc/upload/file/pdf/v2/lcsc/2304140030_HUI-JU-NM1210B224K251CEGN_C841576.pdf; ComponentLink2Description: JLCPCB Part URL; ComponentLink2URL: https://jlcpcb.com/partdetail/C841576; ComponentLink3Description: LCSC Part URL; ComponentLink3URL: https://lcsc.com/product-detail/Multilayer-Ceramic-Capacitors-MLCC---SMD-SMT_HUI-JU-HUI-JU-NM1210B224K251CEGN_C841576.html
footprint CAP-1210 (1210 (3225M) Capacitor)
pins: 1, 2

## NM1210B224K251CEMN
designator C?  Capacitance: 220nF  (hidden comment: *)
Capacitor, Ceramic (MLCC), 220nF, 250V, SMD 1210; Manufacturer: HUI JU; Manufacturer Part Number: NM1210B224K251CEMN; Package Size: 1210; JLCPCB Basic Part: No; JLCPCB Part Number: C2843492; Supplier 1: LCSC; Category: Capacitors - MLCC; Supplier Part Number 1: C2843492; Voltage Rating: 250V; RoHS: Yes; ComponentLink1Description: Datasheet; ComponentLink1URL: https://wmsc.lcsc.com/wmsc/upload/file/pdf/v2/lcsc/2108072030_HUI-JU-NM1210B224K251CEMN_C2843492.pdf; ComponentLink2Description: JLCPCB Part URL; ComponentLink2URL: https://jlcpcb.com/partdetail/C2843492; ComponentLink3Description: LCSC Part URL; ComponentLink3URL: https://lcsc.com/product-detail/Multilayer-Ceramic-Capacitors-MLCC---SMD-SMT_HUI-JU-HUI-JU-NM1210B224K251CEMN_C2843492.html
footprint CAP-1210 (1210 (3225M) Capacitor)
pins: 1, 2

## NM1210B334K251CEMN
designator C?  Capacitance: 330nF  (hidden comment: *)
Capacitor, Ceramic (MLCC), 330nF, ±10%, 250V, X7R, ±10%, SMD 1210; Manufacturer: HUI JU; Manufacturer Part Number: NM1210B334K251CEMN; Package Size: 1210; JLCPCB Basic Part: No; JLCPCB Part Number: C840134; Supplier 1: LCSC; Category: Capacitors - MLCC; Supplier Part Number 1: C840134; Tolerance: ±10%; Voltage Rating: 250V; Temperature Coefficient: X7R; RoHS: Yes; ComponentLink1Description: Datasheet; ComponentLink1URL: https://wmsc.lcsc.com/wmsc/upload/file/pdf/v2/lcsc/2304140030_HUI-JU-NM1210B334K251CEMN_C840134.pdf; ComponentLink2Description: JLCPCB Part URL; ComponentLink2URL: https://jlcpcb.com/partdetail/C840134; ComponentLink3Description: LCSC Part URL; ComponentLink3URL: https://lcsc.com/product-detail/Multilayer-Ceramic-Capacitors-MLCC---SMD-SMT_HUI-JU-HUI-JU-NM1210B334K251CEMN_C840134.html
footprint CAP-1210 (1210 (3225M) Capacitor)
pins: 1, 2

## NM1210B473K631CEGN
designator C?  Capacitance: 47nF  (hidden comment: *)
Capacitor, Ceramic (MLCC), 47nF, ±10%, 630V, ±10%, SMD 1210; Manufacturer: HUI JU; Manufacturer Part Number: NM1210B473K631CEGN; Package Size: 1210; JLCPCB Basic Part: No; JLCPCB Part Number: C784433; Supplier 1: LCSC; Category: Capacitors - MLCC; Supplier Part Number 1: C784433; Tolerance: ±10%; Voltage Rating: 630V; RoHS: Yes; ComponentLink1Description: Datasheet; ComponentLink1URL: https://wmsc.lcsc.com/wmsc/upload/file/pdf/v2/lcsc/2304140030_HUI-JU-NM1210B473K631CEGN_C784433.pdf; ComponentLink2Description: JLCPCB Part URL; ComponentLink2URL: https://jlcpcb.com/partdetail/C784433; ComponentLink3Description: LCSC Part URL; ComponentLink3URL: https://lcsc.com/product-detail/Multilayer-Ceramic-Capacitors-MLCC---SMD-SMT_HUI-JU-HUI-JU-NM1210B473K631CEGN_C784433.html
footprint CAP-1210 (1210 (3225M) Capacitor)
pins: 1, 2

## NM1210B474K251CEMN
designator C?  Capacitance: 470nF  (hidden comment: *)
Capacitor, Ceramic (MLCC), 470nF, ±10%, 250V, X7R, ±10%, SMD 1210; Manufacturer: HUI JU; Manufacturer Part Number: NM1210B474K251CEMN; Package Size: 1210; JLCPCB Basic Part: No; JLCPCB Part Number: C840320; Supplier 1: LCSC; Category: Capacitors - MLCC; Supplier Part Number 1: C840320; Tolerance: ±10%; Voltage Rating: 250V; Temperature Coefficient: X7R; RoHS: Yes; ComponentLink1Description: Datasheet; ComponentLink1URL: https://wmsc.lcsc.com/wmsc/upload/file/pdf/v2/lcsc/2304140030_HUI-JU-NM1210B474K251CEMN_C840320.pdf; ComponentLink2Description: JLCPCB Part URL; ComponentLink2URL: https://jlcpcb.com/partdetail/C840320; ComponentLink3Description: LCSC Part URL; ComponentLink3URL: https://lcsc.com/product-detail/Multilayer-Ceramic-Capacitors-MLCC---SMD-SMT_HUI-JU-HUI-JU-NM1210B474K251CEMN_C840320.html
footprint CAP-1210 (1210 (3225M) Capacitor)
pins: 1, 2

## NV1210B102K202CEDN
designator C?  Capacitance: 1nF  (hidden comment: *)
Capacitor, Ceramic (MLCC), 1nF, ±10%, 2kV, ±10%, SMD 1210; Manufacturer: HUI JU; Manufacturer Part Number: NV1210B102K202CEDN; Package Size: 1210; JLCPCB Basic Part: No; JLCPCB Part Number: C841569; Supplier 1: LCSC; Category: Capacitors - MLCC; Supplier Part Number 1: C841569; Tolerance: ±10%; Voltage Rating: 2kV; RoHS: Yes; ComponentLink1Description: Datasheet; ComponentLink1URL: https://wmsc.lcsc.com/wmsc/upload/file/pdf/v2/lcsc/2304140030_HUI-JU-NV1210B102K202CEDN_C841569.pdf; ComponentLink2Description: JLCPCB Part URL; ComponentLink2URL: https://jlcpcb.com/partdetail/C841569; ComponentLink3Description: LCSC Part URL; ComponentLink3URL: https://lcsc.com/product-detail/Multilayer-Ceramic-Capacitors-MLCC---SMD-SMT_HUI-JU-HUI-JU-NV1210B102K202CEDN_C841569.html
footprint CAP-1210 (1210 (3225M) Capacitor)
pins: 1, 2

## NV1210B103K102CEGN
designator C?  Capacitance: 10nF  (hidden comment: *)
Capacitor, Ceramic (MLCC), 10nF, ±10%, 1kV, ±10%, SMD 1210; Manufacturer: HUI JU; Manufacturer Part Number: NV1210B103K102CEGN; Package Size: 1210; JLCPCB Basic Part: No; JLCPCB Part Number: C841572; Supplier 1: LCSC; Category: Capacitors - MLCC; Supplier Part Number 1: C841572; Tolerance: ±10%; Voltage Rating: 1kV; RoHS: Yes; ComponentLink1Description: Datasheet; ComponentLink1URL: https://wmsc.lcsc.com/wmsc/upload/file/pdf/v2/lcsc/2304140030_HUI-JU-NV1210B103K102CEGN_C841572.pdf; ComponentLink2Description: JLCPCB Part URL; ComponentLink2URL: https://jlcpcb.com/partdetail/C841572; ComponentLink3Description: LCSC Part URL; ComponentLink3URL: https://lcsc.com/product-detail/Multilayer-Ceramic-Capacitors-MLCC---SMD-SMT_HUI-JU-HUI-JU-NV1210B103K102CEGN_C841572.html
footprint CAP-1210 (1210 (3225M) Capacitor)
pins: 1, 2

## NV1210B222K202CEKN
designator C?  Capacitance: 2.2nF  (hidden comment: *)
Capacitor, Ceramic (MLCC), 2.2nF, ±10%, 2kV, ±10%, SMD 1210; Manufacturer: HUI JU; Manufacturer Part Number: NV1210B222K202CEKN; Package Size: 1210; JLCPCB Basic Part: No; JLCPCB Part Number: C841574; Supplier 1: LCSC; Category: Capacitors - MLCC; Supplier Part Number 1: C841574; Tolerance: ±10%; Voltage Rating: 2kV; RoHS: Yes; ComponentLink1Description: Datasheet; ComponentLink1URL: https://wmsc.lcsc.com/wmsc/upload/file/pdf/v2/lcsc/2304140030_HUI-JU-NV1210B222K202CEKN_C841574.pdf; ComponentLink2Description: JLCPCB Part URL; ComponentLink2URL: https://jlcpcb.com/partdetail/C841574; ComponentLink3Description: LCSC Part URL; ComponentLink3URL: https://lcsc.com/product-detail/Multilayer-Ceramic-Capacitors-MLCC---SMD-SMT_HUI-JU-HUI-JU-NV1210B222K202CEKN_C841574.html
footprint CAP-1210 (1210 (3225M) Capacitor)
pins: 1, 2

## NV1210B223K102CEGN
designator C?  Capacitance: 22nF  (hidden comment: *)
Capacitor, Ceramic (MLCC), 22nF, ±10%, 1kV, ±10%, SMD 1210; Manufacturer: HUI JU; Manufacturer Part Number: NV1210B223K102CEGN; Package Size: 1210; JLCPCB Basic Part: No; JLCPCB Part Number: C841575; Supplier 1: LCSC; Category: Capacitors - MLCC; Supplier Part Number 1: C841575; Tolerance: ±10%; Voltage Rating: 1kV; RoHS: Yes; ComponentLink1Description: Datasheet; ComponentLink1URL: https://wmsc.lcsc.com/wmsc/upload/file/pdf/v2/lcsc/2304140030_HUI-JU-NV1210B223K102CEGN_C841575.pdf; ComponentLink2Description: JLCPCB Part URL; ComponentLink2URL: https://jlcpcb.com/partdetail/C841575; ComponentLink3Description: LCSC Part URL; ComponentLink3URL: https://lcsc.com/product-detail/Multilayer-Ceramic-Capacitors-MLCC---SMD-SMT_HUI-JU-HUI-JU-NV1210B223K102CEGN_C841575.html
footprint CAP-1210 (1210 (3225M) Capacitor)
pins: 1, 2

## NV1210B333K102CEGN
designator C?  Capacitance: 33nF  (hidden comment: *)
Capacitor, Ceramic (MLCC), 33nF, ±10%, 1kV, X7R, ±10%, SMD 1210; Manufacturer: HUI JU; Manufacturer Part Number: NV1210B333K102CEGN; Package Size: 1210; JLCPCB Basic Part: No; JLCPCB Part Number: C720962; Supplier 1: LCSC; Category: Capacitors - MLCC; Supplier Part Number 1: C720962; Tolerance: ±10%; Voltage Rating: 1kV; Temperature Coefficient: X7R; RoHS: Yes; ComponentLink1Description: Datasheet; ComponentLink1URL: https://wmsc.lcsc.com/wmsc/upload/file/pdf/v2/lcsc/2304140030_HUI-JU-NV1210B333K102CEGN_C720962.pdf; ComponentLink2Description: JLCPCB Part URL; ComponentLink2URL: https://jlcpcb.com/partdetail/C720962; ComponentLink3Description: LCSC Part URL; ComponentLink3URL: https://lcsc.com/product-detail/Multilayer-Ceramic-Capacitors-MLCC---SMD-SMT_HUI-JU-HUI-JU-NV1210B333K102CEGN_C720962.html
footprint CAP-1210 (1210 (3225M) Capacitor)
pins: 1, 2

## NV1210B472K202CEMN
designator C?  Capacitance: 4.7nF  (hidden comment: *)
Capacitor, Ceramic (MLCC), 4.7nF, 2kV, X7R, SMD 1210; Manufacturer: HUI JU; Manufacturer Part Number: NV1210B472K202CEMN; Package Size: 1210; JLCPCB Basic Part: No; JLCPCB Part Number: C2843493; Supplier 1: LCSC; Category: Capacitors - MLCC; Supplier Part Number 1: C2843493; Voltage Rating: 2kV; Temperature Coefficient: X7R; RoHS: Yes; ComponentLink1Description: Datasheet; ComponentLink1URL: https://wmsc.lcsc.com/wmsc/upload/file/pdf/v2/lcsc/2201201730_HUI-JU-NV1210B472K202CEMN_C2843493.pdf; ComponentLink2Description: JLCPCB Part URL; ComponentLink2URL: https://jlcpcb.com/partdetail/C2843493; ComponentLink3Description: LCSC Part URL; ComponentLink3URL: https://lcsc.com/product-detail/Multilayer-Ceramic-Capacitors-MLCC---SMD-SMT_HUI-JU-HUI-JU-NV1210B472K202CEMN_C2843493.html
footprint CAP-1210 (1210 (3225M) Capacitor)
pins: 1, 2

## NV1210B683K102CEMN
designator C?  Capacitance: 68nF  (hidden comment: *)
Capacitor, Ceramic (MLCC), 68nF, ±10%, 1kV, X7R, ±10%, SMD 1210; Manufacturer: HUI JU; Manufacturer Part Number: NV1210B683K102CEMN; Package Size: 1210; JLCPCB Basic Part: No; JLCPCB Part Number: C840321; Supplier 1: LCSC; Category: Capacitors - MLCC; Supplier Part Number 1: C840321; Tolerance: ±10%; Voltage Rating: 1kV; Temperature Coefficient: X7R; RoHS: Yes; ComponentLink1Description: Datasheet; ComponentLink1URL: https://wmsc.lcsc.com/wmsc/upload/file/pdf/v2/lcsc/2304140030_HUI-JU-NV1210B683K102CEMN_C840321.pdf; ComponentLink2Description: JLCPCB Part URL; ComponentLink2URL: https://jlcpcb.com/partdetail/C840321; ComponentLink3Description: LCSC Part URL; ComponentLink3URL: https://lcsc.com/product-detail/Multilayer-Ceramic-Capacitors-MLCC---SMD-SMT_HUI-JU-HUI-JU-NV1210B683K102CEMN_C840321.html
footprint CAP-1210 (1210 (3225M) Capacitor)
pins: 1, 2

## QMK325BJ154KN-T
designator C?  Capacitance: 150nF  (hidden comment: *)
Capacitor, Ceramic (MLCC), 150nF, ±10%, 250V, X5R, ±10%, SMD 1210; Manufacturer: Taiyo Yuden; Manufacturer Part Number: QMK325BJ154KN-T; Package Size: 1210; JLCPCB Basic Part: No; JLCPCB Part Number: C311695; Supplier 1: LCSC; Category: Capacitors - MLCC; Supplier Part Number 1: C311695; Tolerance: ±10%; Voltage Rating: 250V; Temperature Coefficient: X5R; RoHS: Yes; ComponentLink1Description: Datasheet; ComponentLink1URL: https://wmsc.lcsc.com/wmsc/upload/file/pdf/v2/lcsc/1810171819_Taiyo-Yuden-QMK325BJ154KN-T_C311695.pdf; ComponentLink2Description: JLCPCB Part URL; ComponentLink2URL: https://jlcpcb.com/partdetail/C311695; ComponentLink3Description: LCSC Part URL; ComponentLink3URL: https://lcsc.com/product-detail/Multilayer-Ceramic-Capacitors-MLCC---SMD-SMT_Taiyo-Yuden-Taiyo-Yuden-QMK325BJ154KN-T_C311695.html
footprint CAP-1210 (1210 (3225M) Capacitor)
pins: 1, 2
